# Altium footprint library Resistors.PcbLib: 27 footprints (part 2 of 2)
Each footprint in its own frame and in the unit in brackets; x right, y up, seen from the top. Pads: shape width x height; smd on the part's side, far side on the other; paste and mask are expansions set on the pad; w line width, h text height; cw(c..) or ccw(c..) is an arc to the next point about the centre after c.
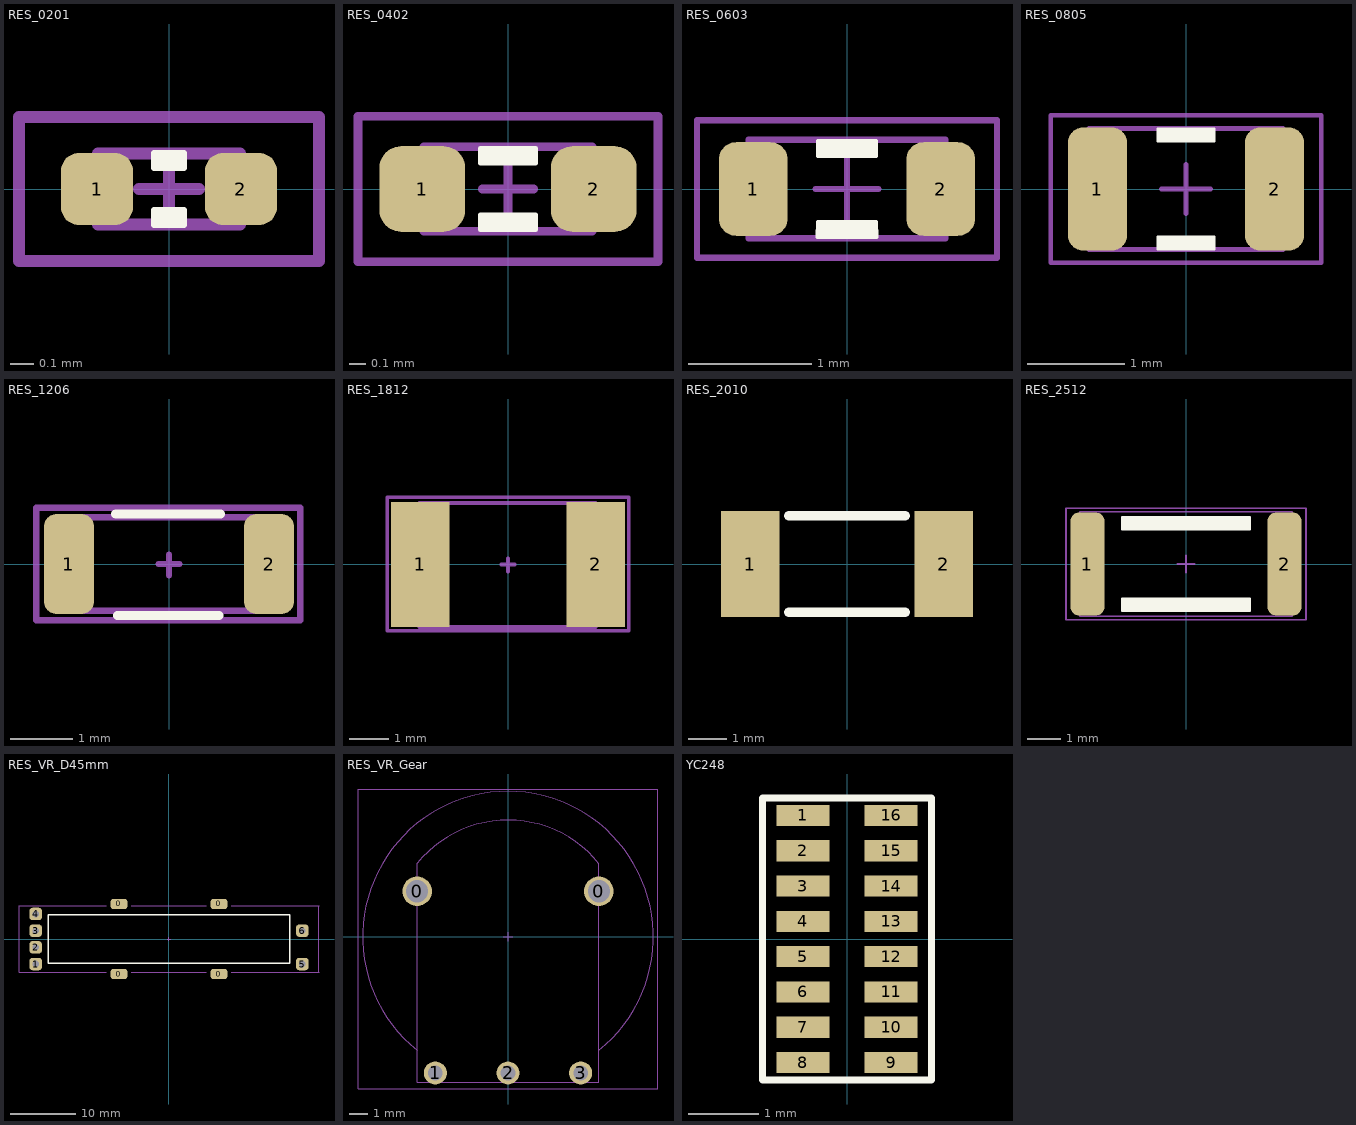
[diagram p1: the footprints below, top view; thin cyan lines are the x and y axes]

## RES_0201 [mil]
height 9.06
pads (2):
  rrect50% 12x12 smd: 1(-12,0) 2(12,0)
Top Overlay:
  region: -2.5,6 2.5,6 2.5,3.5 -2.5,3.5
  region: 2.5,-6 -2.5,-6 -2.5,-3.5 2.5,-3.5
  lines w1: -2.5,-6 -2.5,-3.5 2.5,-3.5 2.5,-6 -2.5,-6 ; -2.5,3.5 2.5,3.5 2.5,6 -2.5,6 -2.5,3.5
Mechanical 7:
  text ".Comment" at -25.59,-7.87 h30
Mechanical 13:
  lines w2: -5,0 5,0 ; 0,-5 0,5 ; -11.81,-5.91 -11.81,5.91 11.81,5.91 11.81,-5.91 -11.81,-5.91
Mechanical 14:
  lines w2: -25,-12 -25,12 25,12 25,-12 -25,-12
  text ".Designator" at -15.75,-7.87 h30
3D body "RES 0201.STEP": height 8.27, standoff -0.39, extent -11.8,-5.9 11.82,5.91

## RES_0402 [mil]
height 13.78
pads (2):
  rrect50% 20x20 smd: 1(-20,0) 2(20,0)
Top Overlay:
  region: 6.5,-9.5 -6.5,-9.5 -6.5,-6 6.5,-6
  region: -6.5,9.5 6.5,9.5 6.5,6 -6.5,6
  lines w1: -6.5,-9.5 6.5,-9.5 6.5,-6 -6.5,-6 -6.5,-9.5 ; -6.5,6 -6.5,9.5 6.5,9.5 6.5,6 -6.5,6
Mechanical 7:
  text ".Comment" at -31.5,-11.81 h43.31
Mechanical 13:
  lines w2: -6,0 6,0 ; 0,-6 0,6 ; -19.69,-9.84 -19.69,9.84 19.68,9.84 19.68,-9.84 -19.69,-9.84
Mechanical 14:
  lines w2: -35,-17 35,-17 35,17 -35,17 -35,-17
  text ".Designator" at -19.69,-9.84 h40
3D body "0402 resistor.STEP": height 13.78, standoff 0, extent -19.69,-9.84 19.69,9.84

## RES_0603 [mil]
height 17.72
pads (2):
  rrect50% 22x30 smd: 1(-30,0) 2(30,0)
Top Overlay:
  region: 9.5,-15.5 -9.5,-15.5 -9.5,-10.5 9.5,-10.5
  region: -9.5,15.5 9.5,15.5 9.5,10.5 -9.5,10.5
  lines w1: -9.5,-15.5 -9.5,-10.5 9.5,-10.5 9.5,-15.5 -9.5,-15.5 ; -9.5,10.5 9.5,10.5 9.5,15.5 -9.5,15.5 -9.5,10.5
Mechanical 7:
  text ".Comment" at -33.46,-14.76 h51.18
Mechanical 13:
  lines w2: -10,0 10,0 ; 0,-10 0,10 ; -31.5,-15.75 31.5,-15.75 31.5,15.75 -31.5,15.75 -31.5,-15.75
Mechanical 14:
  lines w2: -48,-22 -48,22 48,22 48,-22 -48,-22
  text ".Designator" at -32.48,-14.76 h60
3D body "0603 resistor.STEP": height 17.72, standoff 0, extent -31.5,-15.75 31.5,15.75

## RES_0805 [mil]
height 23.62
pads (2):
  rrect50% 24x50 smd: 1(-36,0) 2(36,0)
Top Overlay:
  region: -11.5,24.5 11.5,24.5 11.5,19.5 -11.5,19.5
  region: 11.5,-24.5 -11.5,-24.5 -11.5,-19.5 11.5,-19.5
  lines w1: -11.5,-24.5 -11.5,-19.5 11.5,-19.5 11.5,-24.5 -11.5,-24.5 ; -11.5,19.5 11.5,19.5 11.5,24.5 -11.5,24.5 -11.5,19.5
Mechanical 7:
  text ".Comment" at -44.29,-15.75 h60
Mechanical 13:
  lines w2: -10,0 10,0 ; 0,-10 0,10 ; -39.37,-24.61 -39.37,24.61 39.37,24.61 39.37,-24.61 -39.37,-24.61
Mechanical 14:
  lines w2: -55,-30 55,-30 55,30 -55,30 -55,-30
  text ".Designator" at -40.35,-19.68 h80
3D body "0805 resistor.STEP": height 23.62, standoff 0, extent -37.39,-24.6 41.34,24.61

## RES_1206 [mm] "Chip Resistor, Empaque 1206"
height 0.3
pads (2):
  rrect50% 0.8x1.6 smd: 1(-1.6,0) 2(1.6,0)
Top Overlay:
  lines w0.15: -0.85,0.8 0.825,0.8 ; -0.825,-0.825 0.8,-0.825
Mechanical 7:
  text ".Comment" at -1.625,-0.425 h1.52
Mechanical 13:
  lines w0.1: -1.6,-0.75 -1.6,0.75 1.6,0.75 1.6,-0.75 -1.6,-0.75
Mechanical 14:
  text ".Designator" at -0.787,-0.508 h2.03
Mechanical 15:
  lines w0.1: -0.165,0 0.165,0 ; 0,-0.18 0,0.15 ; -2.125,-0.9 -2.125,0.9 2.1,0.9 2.1,-0.9 -2.125,-0.9
3D body "1206 resistor.STEP": height 0.6, standoff 0, extent -1.575,-0.8 1.625,0.8

## RES_1812 [mm] "Chip Resistor, Empaque 1812"
height 0.3
pads (2):
  rect 1.5x3.2 smd: 1(-2.25,0) 2(2.25,0)
Mechanical 7:
  text ".Comment" at -2.175,-0.5 h2
Mechanical 13:
  lines w0.1: -2.275,-1.6 -2.275,1.575 2.25,1.575 2.25,-1.6 -2.275,-1.6
Mechanical 14:
  text ".Designator" at -1.362,-0.483 h2.03
Mechanical 15:
  lines w0.1: -0.165,0 0.165,0 ; 0,-0.18 0,0.15 ; 3.075,1.725 -3.1,1.725 -3.1,-1.7 3.1,-1.7 3.1,1.725
3D body "1812 SMD Resistor.STEP": height 1.6, standoff 0, extent -2.25,-1.6 2.25,1.6

## RES_2010 [mil]
pads (2):
  rect 60x110 smd: 1(-100,0) 2(100,0)
Top Overlay:
  lines w10: -60,-50 60,-50 ; -60,50 60,50
Mechanical 7:
  text ".Comment" at -83.66,-22.64 h78.74
Mechanical 14:
  text ".Designator" at -83.66,-22.64 h80
3D body "User Library-Chip Resistor_2010 (5025).step": height 22.24, standoff 0, extent -98.43,-48.5 98.43,50

## RES_2512 [mil]
height 23.62
pads (2):
  rrect50% 40x120 smd: 1(-115,0) 2(115,0)
Top Overlay:
  region: -75,40 75,40 75,55 -75,55
  region: 75,-40 -75,-40 -75,-55 75,-55
  lines w2: -75,-55 -75,-40 75,-40 75,-55 -75,-55 ; -75,40 75,40 75,55 -75,55 -75,40
Mechanical 7:
  text ".Comment" at -95.47,-26.57 h98.43
Mechanical 13:
  lines w2: -10,0 10,0 ; 0,-10 0,10 ; -124.02,-61.02 -124.02,61.02 124.02,61.02 124.02,-61.02 -124.02,-61.02
Mechanical 14:
  lines w2: -140,-65 140,-65 140,65 -140,65 -140,-65
  text ".Designator" at -77.76,-19.68 h98.43
3D body "resistor 2512.step": height 63.07, standoff 0, extent -124.99,-59.05 125,59.06

## RES_VR_D45mm [mil]
pads (10):
  rrect50% 100x60 smd: 0(-300,-210) 0(-300,210) 0(300,-210) 0(300,210)
  rrect50% 75x75 hole 39.37: 1(-800,-150) 2(-800,-50) 3(-800,50) 4(-800,150) 5(800,-150) 6(800,50)
Top Overlay:
  lines w10: -725,-145 725,-145 725,145 -725,145 -725,-145
Mechanical 13:
  lines w2: -10,0 10,0 ; 0,-10 0,10
  lines w4: -375,-200 -900,-200 -900,200 -375,200 ; -225,-200 225,-200 ; -225,200 225,200 ; 375,-200 900,-200 900,200 375,200

## RES_VR_Gear [mil]
height 27.56
pads (5):
  round 64 hole 48: 0(-196.85,98.43) 0(196.85,98.43)
  round 50 hole 32: 1(-157.48,-295.28) 2(0,-295.28) 3(157.48,-295.28)
Mechanical 13:
  lines w2: -196.88,-245.85 cw(c0,0) 196.88,-245.85 ; -196.85,158.78 -196.85,-315 196.85,-315 196.85,158.1 ; -196.68,158.64 cw(c0,0) 197.01,158.23 ; -10,0 10,0 ; 0,-10 0,10
Mechanical 14:
  lines w2: -325,-330 -325,320 325,320 325,-330 -325,-330
  text ".Designator" at -70,-30 h50

## YC248 [mm]
pads (16):
  rect 0.75x0.3 smd: 1(-0.625,1.75) 2(-0.625,1.25) 3(-0.625,0.75) 4(-0.625,0.25) 5(-0.625,-0.25) 6(-0.625,-0.75) 7(-0.625,-1.25) 8(-0.625,-1.75) 9(0.625,-1.75) 10(0.625,-1.25) 11(0.625,-0.75) 12(0.625,-0.25) 13(0.625,0.25) 14(0.625,0.75) 15(0.625,1.25) 16(0.625,1.75)
Top Overlay:
  lines w0.1: -1.2,-2 1.2,-2 1.2,2 -1.2,2 -1.2,-2
3D body "YC248-1.STEP": height 0.45, standoff 0, extent -0.8,-2 0.8,2